# Altium footprint library Chronos.PcbLib: 65 footprints (part 3 of 5)
Each footprint in its own frame and in the unit in brackets; x right, y up, seen from the top. Pads: shape width x height; smd on the part's side, far side on the other; paste and mask are expansions set on the pad; w line width, h text height; cw(c..) or ccw(c..) is an arc to the next point about the centre after c.
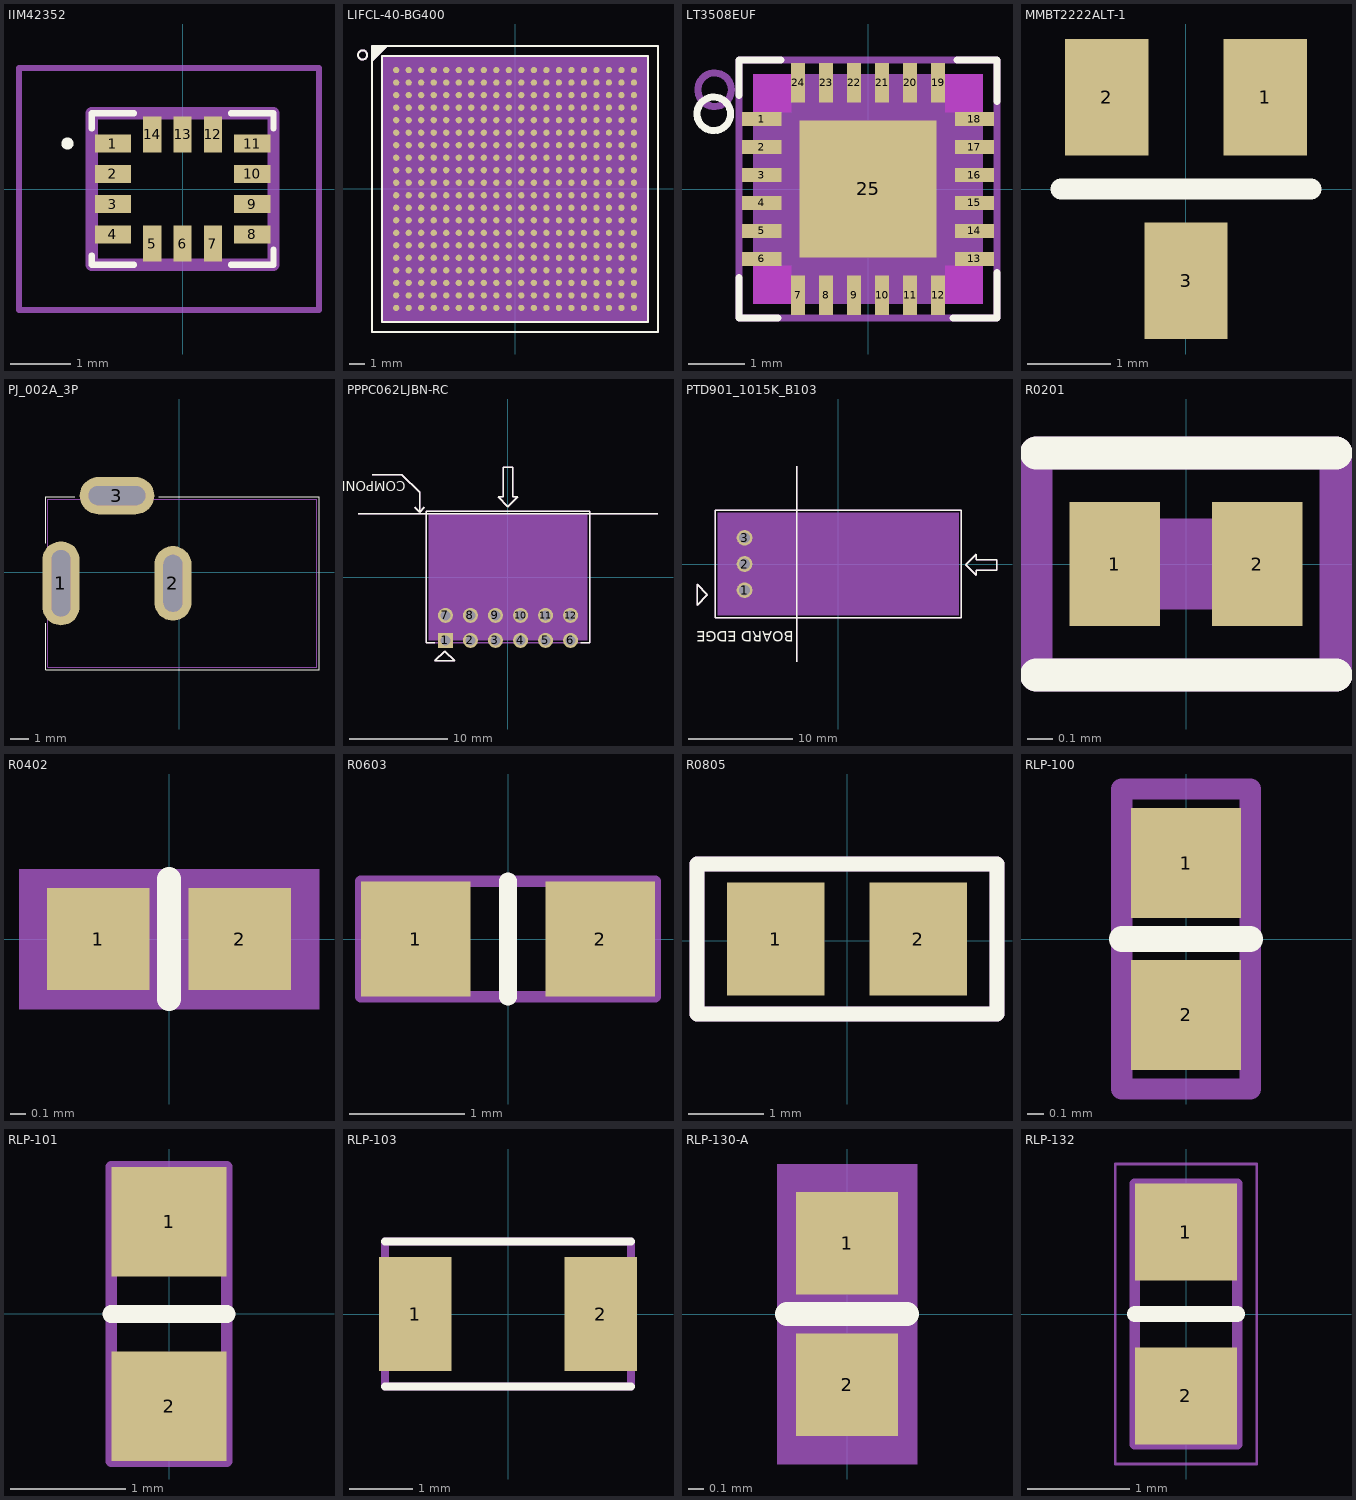
[diagram p2: the footprints below, top view; thin cyan lines are the x and y axes]

## IIM42352 [mm]
pads (14):
  rect 0.6x0.3 smd: 1(-1.15,0.75) 2(-1.15,0.25) 3(-1.15,-0.25) 4(-1.15,-0.75) 8(1.15,-0.75) 9(1.15,-0.25) 10(1.15,0.25) 11(1.15,0.75)
  rect 0.3x0.6 smd: 5(-0.5,-0.9) 6(0,-0.9) 7(0.5,-0.9) 12(0.5,0.9) 13(0,0.9) 14(-0.5,0.9)
Top Overlay:
  lines w0.1: -1.5,-1.1 -1.5,-1.25 -0.8,-1.25 ; -1.5,1 -1.5,1.25 -0.8,1.25 ; 0.8,-1.25 1.5,-1.25 1.5,-1 ; 0.8,1.25 1.5,1.25 1.5,1 ; -1.9,0.7 cw(c-1.9,0.75) -1.9,0.8 cw(c-1.9,0.75) -1.9,0.7
Mechanical 13:
  lines w0.2: -1.5,-1.25 1.5,-1.25 1.5,1.25 -1.5,1.25 -1.5,-1.25
Mechanical 15:
  lines w0.1: -2.7,-2 2.25,-2 2.25,2 -2.7,2 -2.7,-2
3D body "ICM-42688-P.stp": height 0.9, standoff -0.01, extent -1.5,-1.25 1.5,1.25

## LIFCL-40-BG400 [mm] "LIFCL-40-BG400"
pads (400):
  round 0.4 smd: A1(-7.6,7.6) A2(-6.8,7.6) A3(-6,7.6) A4(-5.2,7.6) A5(-4.4,7.6) A6(-3.6,7.6) A7(-2.8,7.6) A8(-2,7.6) A9(-1.2,7.6) A10(-0.4,7.6) A11(0.4,7.6) A12(1.2,7.6) A13(2,7.6) A14(2.8,7.6) A15(3.6,7.6) A16(4.4,7.6) A17(5.2,7.6) A18(6,7.6) A19(6.8,7.6) A20(7.6,7.6) B1(-7.6,6.8) B2(-6.8,6.8) B3(-6,6.8) B4(-5.2,6.8) B5(-4.4,6.8) B6(-3.6,6.8) B7(-2.8,6.8) B8(-2,6.8) B9(-1.2,6.8) B10(-0.4,6.8) B11(0.4,6.8) B12(1.2,6.8) B13(2,6.8) B14(2.8,6.8) B15(3.6,6.8) B16(4.4,6.8) B17(5.2,6.8) B18(6,6.8) B19(6.8,6.8) B20(7.6,6.8) C1(-7.6,6) C2(-6.8,6) C3(-6,6) C4(-5.2,6) C5(-4.4,6) C6(-3.6,6) C7(-2.8,6) C8(-2,6) C9(-1.2,6) C10(-0.4,6) C11(0.4,6) C12(1.2,6) C13(2,6) C14(2.8,6) C15(3.6,6) C16(4.4,6) C17(5.2,6) C18(6,6) C19(6.8,6) C20(7.6,6) D1(-7.6,5.2) D2(-6.8,5.2) D3(-6,5.2) D4(-5.2,5.2) D5(-4.4,5.2) D6(-3.6,5.2) D7(-2.8,5.2) D8(-2,5.2) D9(-1.2,5.2) D10(-0.4,5.2) D11(0.4,5.2) D12(1.2,5.2) D13(2,5.2) D14(2.8,5.2) D15(3.6,5.2) D16(4.4,5.2) D17(5.2,5.2) D18(6,5.2) D19(6.8,5.2) D20(7.6,5.2) E1(-7.6,4.4) E2(-6.8,4.4) E3(-6,4.4) E4(-5.2,4.4) E5(-4.4,4.4) E6(-3.6,4.4) E7(-2.8,4.4) E8(-2,4.4) E9(-1.2,4.4) E10(-0.4,4.4) E11(0.4,4.4) E12(1.2,4.4) E13(2,4.4) E14(2.8,4.4) E15(3.6,4.4) E16(4.4,4.4) E17(5.2,4.4) E18(6,4.4) E19(6.8,4.4) E20(7.6,4.4) F1(-7.6,3.6) F2(-6.8,3.6) F3(-6,3.6) F4(-5.2,3.6) F5(-4.4,3.6) F6(-3.6,3.6) F7(-2.8,3.6) F8(-2,3.6) F9(-1.2,3.6) F10(-0.4,3.6) F11(0.4,3.6) F12(1.2,3.6) F13(2,3.6) F14(2.8,3.6) F15(3.6,3.6) F16(4.4,3.6) F17(5.2,3.6) F18(6,3.6) F19(6.8,3.6) F20(7.6,3.6) G1(-7.6,2.8) G2(-6.8,2.8) G3(-6,2.8) G4(-5.2,2.8) G5(-4.4,2.8) G6(-3.6,2.8) G7(-2.8,2.8) G8(-2,2.8) G9(-1.2,2.8) G10(-0.4,2.8) G11(0.4,2.8) G12(1.2,2.8) G13(2,2.8) G14(2.8,2.8) G15(3.6,2.8) G16(4.4,2.8) G17(5.2,2.8) G18(6,2.8) G19(6.8,2.8) G20(7.6,2.8) H1(-7.6,2) H2(-6.8,2) H3(-6,2) H4(-5.2,2) H5(-4.4,2) H6(-3.6,2) H7(-2.8,2) H8(-2,2) H9(-1.2,2) H10(-0.4,2) H11(0.4,2) H12(1.2,2) H13(2,2) H14(2.8,2) H15(3.6,2) H16(4.4,2) H17(5.2,2) H18(6,2) H19(6.8,2) H20(7.6,2) J1(-7.6,1.2) J2(-6.8,1.2) J3(-6,1.2) J4(-5.2,1.2) J5(-4.4,1.2) J6(-3.6,1.2) J7(-2.8,1.2) J8(-2,1.2) J9(-1.2,1.2) J10(-0.4,1.2) J11(0.4,1.2) J12(1.2,1.2) J13(2,1.2) J14(2.8,1.2) J15(3.6,1.2) J16(4.4,1.2) J17(5.2,1.2) J18(6,1.2) J19(6.8,1.2) J20(7.6,1.2) K1(-7.6,0.4) K2(-6.8,0.4) K3(-6,0.4) K4(-5.2,0.4) K5(-4.4,0.4) K6(-3.6,0.4) K7(-2.8,0.4) K8(-2,0.4) K9(-1.2,0.4) K10(-0.4,0.4) K11(0.4,0.4) K12(1.2,0.4) K13(2,0.4) K14(2.8,0.4) K15(3.6,0.4) K16(4.4,0.4) K17(5.2,0.4) K18(6,0.4) K19(6.8,0.4) K20(7.6,0.4) L1(-7.6,-0.4) L2(-6.8,-0.4) L3(-6,-0.4) L4(-5.2,-0.4) L5(-4.4,-0.4) L6(-3.6,-0.4) L7(-2.8,-0.4) L8(-2,-0.4) L9(-1.2,-0.4) L10(-0.4,-0.4) L11(0.4,-0.4) L12(1.2,-0.4) L13(2,-0.4) L14(2.8,-0.4) L15(3.6,-0.4) L16(4.4,-0.4) L17(5.2,-0.4) L18(6,-0.4) L19(6.8,-0.4) L20(7.6,-0.4) M1(-7.6,-1.2) M2(-6.8,-1.2) M3(-6,-1.2) M4(-5.2,-1.2) M5(-4.4,-1.2) M6(-3.6,-1.2) M7(-2.8,-1.2) M8(-2,-1.2) M9(-1.2,-1.2) M10(-0.4,-1.2) M11(0.4,-1.2) M12(1.2,-1.2) M13(2,-1.2) M14(2.8,-1.2) M15(3.6,-1.2) M16(4.4,-1.2) M17(5.2,-1.2) M18(6,-1.2) M19(6.8,-1.2) M20(7.6,-1.2) N1(-7.6,-2) N2(-6.8,-2) N3(-6,-2) N4(-5.2,-2) N5(-4.4,-2) N6(-3.6,-2) N7(-2.8,-2) N8(-2,-2) N9(-1.2,-2) N10(-0.4,-2) N11(0.4,-2) N12(1.2,-2) N13(2,-2) N14(2.8,-2) N15(3.6,-2) N16(4.4,-2) N17(5.2,-2) N18(6,-2) N19(6.8,-2) N20(7.6,-2) P1(-7.6,-2.8) P2(-6.8,-2.8) P3(-6,-2.8) P4(-5.2,-2.8) P5(-4.4,-2.8) P6(-3.6,-2.8) P7(-2.8,-2.8) P8(-2,-2.8) P9(-1.2,-2.8) P10(-0.4,-2.8) P11(0.4,-2.8) P12(1.2,-2.8) P13(2,-2.8) P14(2.8,-2.8) P15(3.6,-2.8) P16(4.4,-2.8) P17(5.2,-2.8) P18(6,-2.8) P19(6.8,-2.8) P20(7.6,-2.8) R1(-7.6,-3.6) R2(-6.8,-3.6) R3(-6,-3.6) R4(-5.2,-3.6) R5(-4.4,-3.6) R6(-3.6,-3.6) R7(-2.8,-3.6) R8(-2,-3.6) R9(-1.2,-3.6) R10(-0.4,-3.6) R11(0.4,-3.6) R12(1.2,-3.6) R13(2,-3.6) R14(2.8,-3.6) R15(3.6,-3.6) R16(4.4,-3.6) R17(5.2,-3.6) R18(6,-3.6) R19(6.8,-3.6) R20(7.6,-3.6) T1(-7.6,-4.4) T2(-6.8,-4.4) T3(-6,-4.4) T4(-5.2,-4.4) T5(-4.4,-4.4) T6(-3.6,-4.4) T7(-2.8,-4.4) T8(-2,-4.4) T9(-1.2,-4.4) T10(-0.4,-4.4) T11(0.4,-4.4) T12(1.2,-4.4) T13(2,-4.4) T14(2.8,-4.4) T15(3.6,-4.4) T16(4.4,-4.4) T17(5.2,-4.4) T18(6,-4.4) T19(6.8,-4.4) T20(7.6,-4.4) U1(-7.6,-5.2) U2(-6.8,-5.2) U3(-6,-5.2) U4(-5.2,-5.2) U5(-4.4,-5.2) U6(-3.6,-5.2) U7(-2.8,-5.2) U8(-2,-5.2) U9(-1.2,-5.2) U10(-0.4,-5.2) U11(0.4,-5.2) U12(1.2,-5.2) U13(2,-5.2) U14(2.8,-5.2) U15(3.6,-5.2) U16(4.4,-5.2) U17(5.2,-5.2) U18(6,-5.2) U19(6.8,-5.2) U20(7.6,-5.2) V1(-7.6,-6) V2(-6.8,-6) V3(-6,-6) V4(-5.2,-6) V5(-4.4,-6) V6(-3.6,-6) V7(-2.8,-6) V8(-2,-6) V9(-1.2,-6) V10(-0.4,-6) V11(0.4,-6) V12(1.2,-6) V13(2,-6) V14(2.8,-6) V15(3.6,-6) V16(4.4,-6) V17(5.2,-6) V18(6,-6) V19(6.8,-6) V20(7.6,-6) W1(-7.6,-6.8) W2(-6.8,-6.8) W3(-6,-6.8) W4(-5.2,-6.8) W5(-4.4,-6.8) W6(-3.6,-6.8) W7(-2.8,-6.8) W8(-2,-6.8) W9(-1.2,-6.8) W10(-0.4,-6.8) W11(0.4,-6.8) W12(1.2,-6.8) W13(2,-6.8) W14(2.8,-6.8) W15(3.6,-6.8) W16(4.4,-6.8) W17(5.2,-6.8) W18(6,-6.8) W19(6.8,-6.8) W20(7.6,-6.8) Y1(-7.6,-7.6) Y2(-6.8,-7.6) Y3(-6,-7.6) Y4(-5.2,-7.6) Y5(-4.4,-7.6) Y6(-3.6,-7.6) Y7(-2.8,-7.6) Y8(-2,-7.6) Y9(-1.2,-7.6) Y10(-0.4,-7.6) Y11(0.4,-7.6) Y12(1.2,-7.6) Y13(2,-7.6) Y14(2.8,-7.6) Y15(3.6,-7.6) Y16(4.4,-7.6) Y17(5.2,-7.6) Y18(6,-7.6) Y19(6.8,-7.6) Y20(7.6,-7.6)
Top Overlay:
  circle w0.127: c-9.748,8.566 r0.292
  dashed: -9.135,9.135 -9.135,8.135 -8.135,9.135
  lines w0.127: -9.135,-9.135 9.135,-9.135 9.135,9.135 -9.135,9.135 -9.135,-9.135 ; -8.5,-8.5 8.5,-8.5 8.5,8.5 -8.5,8.5 -8.5,-8.5
Top 3D Body:
  region: 8.5,-8.5 8.5,8.5 -8.5,8.5 -8.5,-8.5
Top Assembly:
  circle w0.127: c-9.748,8.566 r0.292
  dashed: -9.135,9.135 -9.135,8.135 -8.135,9.135
  lines w0.127: -9.135,-9.135 9.135,-9.135 9.135,9.135 -9.135,9.135 -9.135,-9.135 ; -8.5,-8.5 8.5,-8.5 8.5,8.5 -8.5,8.5 -8.5,-8.5
  text ".Designator" at 9.94,6.12 h1.02
Mechanical 29:
  text "A12" at 0.984,7.6 h0.18
  text "A13" at 1.784,7.6 h0.18
  text "A15" at 3.384,7.6 h0.18
  text "A16" at 4.184,7.6 h0.18
  text "T16" at 4.184,-4.4 h0.18
  text "C11" at 0.184,6 h0.18
  text "C12" at 0.984,6 h0.18
  text "D6" at -3.744,5.2 h0.18
  text "D8" at -2.144,5.2 h0.18
  text "D3" at -6.144,5.2 h0.18
  text "D7" at -2.944,5.2 h0.18
  text "R15" at 3.384,-3.6 h0.18
  text "E9" at -1.344,4.4 h0.18
  text "U20" at 7.384,-5.2 h0.18
  text "E8" at -2.144,4.4 h0.18
  text "V3" at -6.144,-6 h0.18
  text "P11" at 0.184,-2.8 h0.18
  text "W14" at 2.584,-6.8 h0.18
  text "U1" at -7.744,-5.2 h0.18
  text "Y16" at 4.184,-7.6 h0.18
  text "L14" at 2.584,-0.4 h0.18
  text "Y9" at -1.344,-7.6 h0.18
  text "Y17" at 4.984,-7.6 h0.18
  text "W7" at -2.944,-6.8 h0.18
  text "W13" at 1.784,-6.8 h0.18
  text "N19" at 6.584,-2 h0.18
  text "U6" at -3.744,-5.2 h0.18
  text "V6" at -3.744,-6 h0.18
  text "W17" at 4.984,-6.8 h0.18
  text "Y3" at -6.144,-7.6 h0.18
  text "D15" at 3.384,5.2 h0.18
  text "W6" at -3.744,-6.8 h0.18
  text "W10" at -0.616,-6.8 h0.18
  text "D13" at 1.784,5.2 h0.18
  text "P10" at -0.616,-2.8 h0.18
  text "R13" at 1.784,-3.6 h0.18
  text "Y10" at -0.616,-7.6 h0.18
  text "W12" at 0.984,-6.8 h0.18
  text "P7" at -2.944,-2.8 h0.18
  text "U7" at -2.944,-5.2 h0.18
  text "T11" at 0.184,-4.4 h0.18
  text "W9" at -1.344,-6.8 h0.18
  text "T18" at 5.784,-4.4 h0.18
  text "U18" at 5.784,-5.2 h0.18
  text "V8" at -2.144,-6 h0.18
  text "T9" at -1.344,-4.4 h0.18
  text "U14" at 2.584,-5.2 h0.18
  text "E12" at 0.984,4.4 h0.18
  text "V11" at 0.184,-6 h0.18
  text "W15" at 3.384,-6.8 h0.18
  text "P18" at 5.784,-2.8 h0.18
  text "B9" at -1.344,6.8 h0.18
  text "T1" at -7.744,-4.4 h0.18
  text "A8" at -2.144,7.6 h0.18
  text "Y8" at -2.144,-7.6 h0.18
  text "B10" at -0.616,6.8 h0.18
  text "E13" at 1.784,4.4 h0.18
  text "U11" at 0.184,-5.2 h0.18
  text "A10" at -0.616,7.6 h0.18
  text "R10" at -0.616,-3.6 h0.18
  text "B6" at -3.744,6.8 h0.18
  text "A6" at -3.744,7.6 h0.18
  text "Y11" at 0.184,-7.6 h0.18
  text "A9" at -1.344,7.6 h0.18
  text "V7" at -2.944,-6 h0.18
  text "B7" at -2.944,6.8 h0.18
  text "W8" at -2.144,-6.8 h0.18
  text "A7" at -2.944,7.6 h0.18
  text "R5" at -4.544,-3.6 h0.18
  text "B8" at -2.144,6.8 h0.18
  text "W1" at -7.744,-6.8 h0.18
  text "Y12" at 0.984,-7.6 h0.18
  text "V12" at 0.984,-6 h0.18
  text "V9" at -1.344,-6 h0.18
  text "T7" at -2.944,-4.4 h0.18
  text "V14" at 2.584,-6 h0.18
  text "P8" at -2.144,-2.8 h0.18
  text "Y18" at 5.784,-7.6 h0.18
  text "T6" at -3.744,-4.4 h0.18
  text "N10" at -0.616,-2 h0.18
  text "N12" at 0.984,-2 h0.18
  text "K12" at 0.984,0.4 h0.18
  text "N8" at -2.144,-2 h0.18
  text "K9" at -1.344,0.4 h0.18
  text "H9" at -1.344,2 h0.18
  text "W11" at 0.184,-6.8 h0.18
  text "U16" at 4.184,-5.2 h0.18
  text "P20" at 7.384,-2.8 h0.18
  text "Y2" at -6.944,-7.6 h0.18
  text "V10" at -0.616,-6 h0.18
  text "R11" at 0.184,-3.6 h0.18
  text "Y7" at -2.944,-7.6 h0.18
  text "P17" at 4.984,-2.8 h0.18
  text "A2" at -6.944,7.6 h0.18
  text "Y6" at -3.744,-7.6 h0.18
  text "D2" at -6.944,5.2 h0.18
  text "Y15" at 3.384,-7.6 h0.18
  text "A3" at -6.144,7.6 h0.18
  text "P13" at 1.784,-2.8 h0.18
  text "T12" at 0.984,-4.4 h0.18
  text "P9" at -1.344,-2.8 h0.18
  text "V16" at 4.184,-6 h0.18
  text "F20" at 7.384,3.6 h0.18
  text "A4" at -5.344,7.6 h0.18
  text "T10" at -0.616,-4.4 h0.18
  text "B4" at -5.344,6.8 h0.18
  text "P12" at 0.984,-2.8 h0.18
  text "C1" at -7.744,6 h0.18
  text "U12" at 0.984,-5.2 h0.18
  text "R7" at -2.944,-3.6 h0.18
  text "D1" at -7.744,5.2 h0.18
  text "N20" at 7.384,-2 h0.18
  text "B3" at -6.144,6.8 h0.18
  text "R12" at 0.984,-3.6 h0.18
  text "E20" at 7.384,4.4 h0.18
  text "B2" at -6.944,6.8 h0.18
  text "U15" at 3.384,-5.2 h0.18
  text "G14" at 2.584,2.8 h0.18
  text "Y14" at 2.584,-7.6 h0.18
  text "Y13" at 1.784,-7.6 h0.18
  text "H12" at 0.984,2 h0.18
  text "R6" at -3.744,-3.6 h0.18
  text "B1" at -7.744,6.8 h0.18
  text "V17" at 4.984,-6 h0.18
  text "T8" at -2.144,-4.4 h0.18
  text "V1" at -7.744,-6 h0.18
  text "W18" at 5.784,-6.8 h0.18
  text "P19" at 6.584,-2.8 h0.18
  text "R9" at -1.344,-3.6 h0.18
  text "M19" at 6.584,-1.2 h0.18
  text "U10" at -0.616,-5.2 h0.18
  text "R8" at -2.144,-3.6 h0.18
  text "T14" at 2.584,-4.4 h0.18
  text "C2" at -6.944,6 h0.18
  text "T13" at 1.784,-4.4 h0.18
  text "E16" at 4.184,4.4 h0.18
  text "N14" at 2.584,-2 h0.18
  text "Y5" at -4.544,-7.6 h0.18
  text "B5" at -4.544,6.8 h0.18
  text "W5" at -4.544,-6.8 h0.18
  text "T17" at 4.984,-4.4 h0.18
  text "C4" at -5.344,6 h0.18
  text "R16" at 4.184,-3.6 h0.18
  text "N13" at 1.784,-2 h0.18
  text "P14" at 2.584,-2.8 h0.18
  text "E19" at 6.584,4.4 h0.18
  text "B13" at 1.784,6.8 h0.18
  text "B15" at 3.384,6.8 h0.18
  text "G15" at 3.384,2.8 h0.18
  text "M20" at 7.384,-1.2 h0.18
  text "V20" at 7.384,-6 h0.18
  text "W20" at 7.384,-6.8 h0.18
  text "T20" at 7.384,-4.4 h0.18
  text "R18" at 5.784,-3.6 h0.18
  text "B11" at 0.184,6.8 h0.18
  text "K2" at -6.944,0.4 h0.18
  text "J1" at -7.744,1.2 h0.18
  text "K4" at -5.344,0.4 h0.18
  text "K1" at -7.744,0.4 h0.18
  text "K3" at -6.144,0.4 h0.18
  text "E18" at 5.784,4.4 h0.18
  text "N11" at 0.184,-2 h0.18
  text "N9" at -1.344,-2 h0.18
  text "L9" at -1.344,-0.4 h0.18
  text "L12" at 0.984,-0.4 h0.18
  text "J12" at 0.984,1.2 h0.18
  text "F12" at 0.984,3.6 h0.18
  text "F9" at -1.344,3.6 h0.18
  text "J9" at -1.344,1.2 h0.18
  text "D17" at 4.984,5.2 h0.18
  text "J2" at -6.944,1.2 h0.18
  text "C14" at 2.584,6 h0.18
  text "C9" at -1.344,6 h0.18
  text "B14" at 2.584,6.8 h0.18
  text "C7" at -2.944,6 h0.18
  text "C5" at -4.544,6 h0.18
  text "R17" at 4.984,-3.6 h0.18
  text "C13" at 1.784,6 h0.18
  text "D4" at -5.344,5.2 h0.18
  text "F1" at -7.744,3.6 h0.18
  text "E3" at -6.144,4.4 h0.18
  text "E4" at -5.344,4.4 h0.18
  text "D9" at -1.344,5.2 h0.18
  text "E7" at -2.944,4.4 h0.18
  text "E2" at -6.944,4.4 h0.18
  text "E10" at -0.616,4.4 h0.18
  text "D10" at -0.616,5.2 h0.18
  text "D5" at -4.544,5.2 h0.18
  text "U17" at 4.984,-5.2 h0.18
  text "G20" at 7.384,2.8 h0.18
  text "J13" at 1.784,1.2 h0.18
  text "K14" at 2.584,0.4 h0.18
  text "J14" at 2.584,1.2 h0.18
  text "H16" at 4.184,2 h0.18
  text "K15" at 3.384,0.4 h0.18
  text "K16" at 4.184,0.4 h0.18
  text "H19" at 6.584,2 h0.18
  text "H20" at 7.384,2 h0.18
  text "H17" at 4.984,2 h0.18
  text "K17" at 4.984,0.4 h0.18
  text "H13" at 1.784,2 h0.18
  text "K18" at 5.784,0.4 h0.18
  text "K19" at 6.584,0.4 h0.18
  text "K20" at 7.384,0.4 h0.18
  text "L18" at 5.784,-0.4 h0.18
  text "L17" at 4.984,-0.4 h0.18
  text "H18" at 5.784,2 h0.18
  text "H14" at 2.584,2 h0.18
  text "H15" at 3.384,2 h0.18
  text "J15" at 3.384,1.2 h0.18
  text "J16" at 4.184,1.2 h0.18
  text "J19" at 6.584,1.2 h0.18
  text "J20" at 7.384,1.2 h0.18
  text "K13" at 1.784,0.4 h0.18
  text "R20" at 7.384,-3.6 h0.18
  text "R19" at 6.584,-3.6 h0.18
  text "P16" at 4.184,-2.8 h0.18
  text "P15" at 3.384,-2.8 h0.18
  text "T5" at -4.544,-4.4 h0.18
  text "U5" at -4.544,-5.2 h0.18
  text "V5" at -4.544,-6 h0.18
  text "T4" at -5.344,-4.4 h0.18
  text "U4" at -5.344,-5.2 h0.18
  text "V4" at -5.344,-6 h0.18
  text "W4" at -5.344,-6.8 h0.18
  text "Y4" at -5.344,-7.6 h0.18
  text "T3" at -6.144,-4.4 h0.18
  text "U3" at -6.144,-5.2 h0.18
  text "T2" at -6.944,-4.4 h0.18
  text "U2" at -6.944,-5.2 h0.18
  text "V2" at -6.944,-6 h0.18
  text "W2" at -6.944,-6.8 h0.18
  text "N3" at -6.144,-2 h0.18
  text "N2" at -6.944,-2 h0.18
  text "N1" at -7.744,-2 h0.18
  text "M1" at -7.744,-1.2 h0.18
  text "F7" at -2.944,3.6 h0.18
  text "F6" at -3.744,3.6 h0.18
  text "F5" at -4.544,3.6 h0.18
  text "F4" at -5.344,3.6 h0.18
  text "G2" at -6.944,2.8 h0.18
  text "G1" at -7.744,2.8 h0.18
  text "G8" at -2.144,2.8 h0.18
  text "H8" at -2.144,2 h0.18
  text "H7" at -2.944,2 h0.18
  text "H6" at -3.744,2 h0.18
  text "H5" at -4.544,2 h0.18
  text "G7" at -2.944,2.8 h0.18
  text "G6" at -3.744,2.8 h0.18
  text "F8" at -2.144,3.6 h0.18
  text "H2" at -6.944,2 h0.18
  text "H1" at -7.744,2 h0.18
  text "F3" at -6.144,3.6 h0.18
  text "F2" at -6.944,3.6 h0.18
  text "G5" at -4.544,2.8 h0.18
  text "G4" at -5.344,2.8 h0.18
  text "J8" at -2.144,1.2 h0.18
  text "J7" at -2.944,1.2 h0.18
  text "G3" at -6.144,2.8 h0.18
  text "J6" at -3.744,1.2 h0.18
  text "J5" at -4.544,1.2 h0.18
  text "J4" at -5.344,1.2 h0.18
  text "J3" at -6.144,1.2 h0.18
  text "B20" at 7.384,6.8 h0.18
  text "C20" at 7.384,6 h0.18
  text "A19" at 6.584,7.6 h0.18
  text "A18" at 5.784,7.6 h0.18
  text "B18" at 5.784,6.8 h0.18
  text "C18" at 5.784,6 h0.18
  text "B17" at 4.984,6.8 h0.18
  text "D18" at 5.784,5.2 h0.18
  text "C16" at 4.184,6 h0.18
  text "Y19" at 6.584,-7.6 h0.18
  text "W19" at 6.584,-6.8 h0.18
  text "V19" at 6.584,-6 h0.18
  text "V18" at 5.784,-6 h0.18
  text "F18" at 5.784,3.6 h0.18
  text "F16" at 4.184,3.6 h0.18
  text "N16" at 4.184,-2 h0.18
  text "M18" at 5.784,-1.2 h0.18
  text "M16" at 4.184,-1.2 h0.18
  text "M17" at 4.984,-1.2 h0.18
  text "M14" at 2.584,-1.2 h0.18
  text "N15" at 3.384,-2 h0.18
  text "M15" at 3.384,-1.2 h0.18
  text "E17" at 4.984,4.4 h0.18
  text "L16" at 4.184,-0.4 h0.18
  text "L20" at 7.384,-0.4 h0.18
  text "F14" at 2.584,3.6 h0.18
  text "F13" at 1.784,3.6 h0.18
  text "G13" at 1.784,2.8 h0.18
  text "L19" at 6.584,-0.4 h0.18
  text "L15" at 3.384,-0.4 h0.18
  text "D16" at 4.184,5.2 h0.18
  text "D14" at 2.584,5.2 h0.18
  text "G19" at 6.584,2.8 h0.18
  text "E5" at -4.544,4.4 h0.18
  text "H3" at -6.144,2 h0.18
  text "P3" at -6.144,-2.8 h0.18
  text "L3" at -6.144,-0.4 h0.18
  text "V15" at 3.384,-6 h0.18
  text "U13" at 1.784,-5.2 h0.18
  text "G17" at 4.984,2.8 h0.18
  text "J18" at 5.784,1.2 h0.18
  text "M4" at -5.344,-1.2 h0.18
  text "M7" at -2.944,-1.2 h0.18
  text "L6" at -3.744,-0.4 h0.18
  text "D11" at 0.184,5.2 h0.18
  text "F17" at 4.984,3.6 h0.18
  text "F19" at 6.584,3.6 h0.18
  text "D12" at 0.984,5.2 h0.18
  text "R4" at -5.344,-3.6 h0.18
  text "R3" at -6.144,-3.6 h0.18
  text "G18" at 5.784,2.8 h0.18
  text "N6" at -3.744,-2 h0.18
  text "F15" at 3.384,3.6 h0.18
  text "M6" at -3.744,-1.2 h0.18
  text "L8" at -2.144,-0.4 h0.18
  text "L5" at -4.544,-0.4 h0.18
  text "M5" at -4.544,-1.2 h0.18
  text "L7" at -2.944,-0.4 h0.18
  text "K8" at -2.144,0.4 h0.18
  text "M3" at -6.144,-1.2 h0.18
  text "E15" at 3.384,4.4 h0.18
  text "N7" at -2.944,-2 h0.18
  text "P6" at -3.744,-2.8 h0.18
  text "N5" at -4.544,-2 h0.18
  text "K6" at -3.744,0.4 h0.18
  text "N4" at -5.344,-2 h0.18
  text "K7" at -2.944,0.4 h0.18
  text "K5" at -4.544,0.4 h0.18
  text "P1" at -7.744,-2.8 h0.18
  text "P5" at -4.544,-2.8 h0.18
  text "P2" at -6.944,-2.8 h0.18
  text "R1" at -7.744,-3.6 h0.18
  text "M2" at -6.944,-1.2 h0.18
  text "R2" at -6.944,-3.6 h0.18
  text "L2" at -6.944,-0.4 h0.18
  text "L1" at -7.744,-0.4 h0.18
  text "U19" at 6.584,-5.2 h0.18
  text "N17" at 4.984,-2 h0.18
  text "E11" at 0.184,4.4 h0.18
  text "L13" at 1.784,-0.4 h0.18
  text "W3" at -6.144,-6.8 h0.18
  text "W16" at 4.184,-6.8 h0.18
  text "Y1" at -7.744,-7.6 h0.18
  text "V13" at 1.784,-6 h0.18
  text "Y20" at 7.384,-7.6 h0.18
  text "L4" at -5.344,-0.4 h0.18
  text "P4" at -5.344,-2.8 h0.18
  text "R14" at 2.584,-3.6 h0.18
  text "M13" at 1.784,-1.2 h0.18
  text "M8" at -2.144,-1.2 h0.18
  text "M9" at -1.344,-1.2 h0.18
  text "L10" at -0.616,-0.4 h0.18
  text "M10" at -0.616,-1.2 h0.18
  text "N18" at 5.784,-2 h0.18
  text "T19" at 6.584,-4.4 h0.18
  text "T15" at 3.384,-4.4 h0.18
  text "E6" at -3.744,4.4 h0.18
  text "H4" at -5.344,2 h0.18
  text "E1" at -7.744,4.4 h0.18
  text "F11" at 0.184,3.6 h0.18
  text "G9" at -1.344,2.8 h0.18
  text "K10" at -0.616,0.4 h0.18
  text "J10" at -0.616,1.2 h0.18
  text "H10" at -0.616,2 h0.18
  text "G10" at -0.616,2.8 h0.18
  text "F10" at -0.616,3.6 h0.18
  text "G11" at 0.184,2.8 h0.18
  text "G12" at 0.984,2.8 h0.18
  text "G16" at 4.184,2.8 h0.18
  text "A1" at -7.744,7.6 h0.18
  text "A5" at -4.544,7.6 h0.18
  text "C3" at -6.144,6 h0.18
  text "C6" at -3.744,6 h0.18
  text "C10" at -0.616,6 h0.18
  text "U9" at -1.344,-5.2 h0.18
  text "U8" at -2.144,-5.2 h0.18
  text "C8" at -2.144,6 h0.18
  text "H11" at 0.184,2 h0.18
  text "J11" at 0.184,1.2 h0.18
  text "K11" at 0.184,0.4 h0.18
  text "L11" at 0.184,-0.4 h0.18
  text "M11" at 0.184,-1.2 h0.18
  text "M12" at 0.984,-1.2 h0.18
  text "J17" at 4.984,1.2 h0.18
  text "E14" at 2.584,4.4 h0.18
  text "A14" at 2.584,7.6 h0.18
  text "A11" at 0.184,7.6 h0.18
  text "B12" at 0.984,6.8 h0.18
  text "C15" at 3.384,6 h0.18
  text "B16" at 4.184,6.8 h0.18
  text "C17" at 4.984,6 h0.18
  text "D20" at 7.384,5.2 h0.18
  text "D19" at 6.584,5.2 h0.18
  text "C19" at 6.584,6 h0.18
  text "B19" at 6.584,6.8 h0.18
  text "A17" at 4.984,7.6 h0.18
  text "A20" at 7.384,7.6 h0.18
3D body "BG400C.STEP": height 1, standoff 0, extent -8.5,-8.5 8.5,8.5

## LT3508EUF [mm] "LT3508EUF"
pads (25):
  rect 0.7x0.25 smd: 1(-1.9,1.25) 2(-1.9,0.75) 3(-1.9,0.25) 4(-1.9,-0.25) 5(-1.9,-0.75) 6(-1.9,-1.25) 13(1.9,-1.25) 14(1.9,-0.75) 15(1.9,-0.25) 16(1.9,0.25) 17(1.9,0.75) 18(1.9,1.25)
  rect 0.25x0.7 smd: 7(-1.25,-1.9) 8(-0.75,-1.9) 9(-0.25,-1.9) 10(0.25,-1.9) 11(0.75,-1.9) 12(1.25,-1.9) 19(1.25,1.9) 20(0.75,1.9) 21(0.25,1.9) 22(-0.25,1.9) 23(-0.75,1.9) 24(-1.25,1.9)
  rect 2.45x2.45 smd: 25(0,0)
Top Layer keep-out:
  region: -2.05,-1.375 -2.05,-2.05 -1.375,-2.05 -1.375,-1.375
  region: 2.05,-1.375 2.05,-2.05 1.375,-2.05 1.375,-1.375
  region: -2.05,1.375 -2.05,2.05 -1.375,2.05 -1.375,1.375
  region: 2.05,1.375 2.05,2.05 1.375,2.05 1.375,1.375
Top Overlay:
  circle w0.127: c-2.757,1.344 r0.3
  lines w0.127: -2.304,-1.581 -2.304,-2.304 -1.614,-2.304 ; -2.304,1.674 -2.304,2.304 -1.561,2.304 ; 1.521,-2.304 2.304,-2.304 2.304,-1.49 ; 1.588,2.304 2.304,2.304 2.304,1.569
  text ".Designator" at 5.864,1.253 h1.02
Top 3D Body:
  region: -2.05,2.05 -2.05,-2.05 2.05,-2.05 2.05,2.05
Top Assembly:
  circle w0.127: c-2.742,1.774 r0.3
  lines w0.127: -2.304,-2.304 -2.304,2.304 2.304,2.304 2.304,-2.304 -2.304,-2.304
Mechanical 29:
  text "23" at -0.75,1.494 h0.51
  text "20" at 0.75,1.494 h0.51
  text "11" at 0.75,-2.306 h0.51
  text "19" at 1.25,1.494 h0.51
  text "12" at 1.25,-2.306 h0.51
  text "21" at 0.25,1.494 h0.51
  text "17" at 1.9,0.344 h0.51
  text "8" at -0.75,-2.103 h0.51
  text "18" at 1.9,0.844 h0.51
  text "1" at -1.9,1.047 h0.51
  text "7" at -1.25,-2.103 h0.51
  text "24" at -1.25,1.494 h0.51
  text "22" at -0.25,1.494 h0.51
  text "2" at -1.9,0.547 h0.51
  text "10" at 0.25,-2.306 h0.51
  text "9" at -0.25,-2.103 h0.51
  text "25" at 0,-0.406 h0.51
  text "16" at 1.9,-0.156 h0.51
  text "15" at 1.9,-0.656 h0.51
  text "14" at 1.9,-1.156 h0.51
  text "13" at 1.9,-1.656 h0.51
  text "6" at -1.9,-1.453 h0.51
  text "5" at -1.9,-0.953 h0.51
  text "4" at -1.9,-0.453 h0.51
  text "3" at -1.9,0.047 h0.51
3D body "QFN-24_UF_LIT.step": height 0.8, standoff 0, extent -2.05,-2.05 2.05,2.05

## MMBT2222ALT-1 [mm] "MMBT2222ALT-1"
pads (3):
  rect 1x1.4 smd: 1(0.956,1.1) 2(-0.944,1.1) 3(0.006,-1.1)
Top Overlay:
  lines w0.254: -1.495,0 1.507,0
Mechanical 29:
  text "2" at -0.944,1.354 h0.64
  text "3" at 0.006,-0.846 h0.64
  text "1" at 0.956,1.354 h0.64
3D body "ROHM - SST3 - SOT-23.step": height 1.2, standoff 0, extent -1.45,-1.123 1.45,1.377

## PJ_002A_3P [mm] "PJ_002A_3P"
pads (3):
  oval 2x4.5 hole 1.016 slot 3.556 at 90 deg: 1(-6.35,-0.6)
  oval 2x4 hole 1.016 slot 3.048 at 90 deg: 2(-0.35,-0.6)
  oval 4x2 hole 1.016 slot 3.048 at 0 deg: 3(-3.35,4.1)
Top Overlay:
  lines w0.025: -7.177,-2.75 -7.177,-5.227 7.477,-5.227 7.477,4.027 -1.1,4.027 ; -7.177,1.55 -7.177,4.027 -5.6,4.027
  text ".Designator" at -0.03,4.715 h1.02
Top Assembly:
  lines w0.025: -7.05,-5.1 -7.05,3.9 7.35,3.9 7.35,-5.1 -7.05,-5.1
  text "2" at -0.956,-7.04 h1.6
  text "3" at -3.951,5.558 h1.6
  text "1" at -8.803,-1.322 h1.6
Mechanical 29:
  text "2" at -0.35,-0.194 h1.02
  text "3" at -3.35,4.506 h1.02
  text "1" at -6.35,0.213 h1.02
Mechanical34:
  text "MFG P/N:PJ-002A" at -22.101,-24.332 h1.27
  text "MFG:CUI" at -22.101,-21.932 h1.27
Mechanical35:
  text "A.C.T" at -22.101,-19.532 h1.27
Mechanical38:
  text "COMP HEIGHT:11.0mm" at -22.801,14.768 h1.27
  text "PADSTACK(S):1_0x3_5h2_0w4_5o,1_0x3_0h2_0w4_0o" at -22.801,16.968 h1.27
  text "SYMBOL NAME:pj_002a_3p" at -22.901,19.168 h1.27
3D body "step_temp.STEP": height 11.1, standoff -3.4, extent -7.073,-5.336 7.327,4.064

## PPPC062LJBN-RC [mil] "PPPC062LJBN-RC"
pads (12):
  rect 60x60 hole 40: 1(-250,-252.76)
  round 60 hole 40: 2(-150,-252.76) 3(-50,-252.76) 4(50,-252.76) 5(150,-252.76) 6(250,-252.76) 7(-250,-152.76) 8(-150,-152.76) 9(-50,-152.76) 10(50,-152.76) 11(150,-152.76) 12(250,-152.76)
Top Overlay:
  lines w5: -599.59,252.75 599.59,252.75 ; -542.52,409.75 -424.41,409.75 -353.55,338.88 -353.55,260.14 ; -373.23,279.82 -353.55,260.14 ; -333.86,279.82 -353.55,260.14 ; -293.29,-262.75 -326.73,-262.75 -326.73,262.75 326.73,262.75 326.73,-262.75 291.78,-262.75 ; -292.51,-334.75 -213.77,-334.75 -253.14,-295.38 -292.51,-334.75 ; -39.5,321.47 -19.81,321.47 -19.81,439.58 19.56,439.58 19.56,321.47 39.24,321.47 -0.13,282.1 -39.5,321.47
  text ".Designator" at 382.54,-69.77 h40
  text "COMPONENT EDGE" at -409.63,383.32 h40
Top 3D Body:
  region: 316.73,-252.75 316.73,252.75 -316.73,252.75 -316.73,-252.75
Top Assembly:
  lines w5: -599.59,252.75 599.59,252.75 ; -542.52,409.75 -424.41,409.75 -353.55,338.88 -353.55,260.14 ; -373.23,279.82 -353.55,260.14 ; -333.86,279.82 -353.55,260.14 ; -326.73,-262.75 -326.73,262.75 326.73,262.75 326.73,-262.75 -326.73,-262.75 ; -292.51,-334.75 -213.77,-334.75 -253.14,-295.38 -292.51,-334.75 ; -39.5,321.47 -19.81,321.47 -19.81,439.58 19.56,439.58 19.56,321.47 39.24,321.47 -0.13,282.1 -39.5,321.47
  text "COMPONENT EDGE" at -409.63,383.32 h40
Mechanical 29:
  text "7" at -241.31,-166.1 h20
  text "4" at 48.69,-264.61 h20
  text "10" at 48.69,-172.6 h20
  text "3" at -51.31,-264.61 h20
  text "9" at -51.31,-164.6 h20
  text "2" at -151.31,-264.61 h20
  text "1" at -251.31,-264.61 h20
  text "8" at -151.31,-164.6 h20
  text "6" at 248.69,-264.61 h20
  text "12" at 248.69,-172.6 h20
  text "11" at 148.69,-172.6 h20
  text "5" at 148.69,-264.61 h20
Mechanical 32:
  text "LEAD LENGTH IS 124 MIL" at -325.6,-77.84 h40
3D body: height 150, standoff 0, extent -316.73,-252.75 316.73,252.75

## PTD901_1015K_B103 [mil] "PTD901_1015K_B103"
pads (3):
  round 59.06 hole 40: 1(-353.35,-98.43) 2(-353.35,0) 3(-353.35,98.43)
Top Overlay:
  lines w5: -156.5,-367.64 -156.5,367.64 ; -532.39,-155.53 -532.39,-76.79 -493.02,-116.16 -532.39,-155.53 ; -463.74,-202.91 463.74,-202.91 463.74,202.91 -463.74,202.91 -463.74,-202.91 ; 479.74,-3.46 519.11,-42.83 519.11,-23.14 597.85,-23.14 597.85,16.23 519.11,16.23 519.11,35.91 479.74,-3.46
  text "BOARD EDGE" at -168.5,-252.86 h40
  text ".Designator" at -475.5,-11.86 h40
Top 3D Body:
  region: 453.74,-192.91 453.74,192.91 -453.74,192.91 -453.74,-192.91
Top Assembly:
  lines w5: -156.5,-367.64 -156.5,367.64 ; -532.39,-155.53 -493.02,-116.16 -532.39,-76.79 -532.39,-155.53 ; -463.74,-202.91 463.74,-202.91 463.74,202.91 -463.74,202.91 -463.74,-202.91 ; 479.74,-3.46 519.11,-42.83 519.11,-23.14 597.85,-23.14 597.85,16.23 519.11,16.23 519.11,35.91 479.74,-3.46
  text "BOARD EDGE" at -173.59,239.57 h40
Mechanical 29:
  text "1" at -353.35,-106.43 h20
  text "2" at -353.35,-8 h20
  text "3" at -353.35,90.43 h20
Mechanical 32:
  text "LEAD LENGTH IS 3.5MM" at -290.63,-168.52 h40
3D body: height 150, standoff 0, extent -453.74,-192.91 453.74,192.91

## R0201 [mm] "R0201"
pads (2):
  rect 0.35x0.48 smd: 1(-0.275,0) 2(0.275,0)
Top Overlay:
  lines w0.127: -0.579,-0.429 0.579,-0.429 ; -0.579,0.429 0.579,0.429
Top 3D Body:
  region: -0.325,0.175 -0.325,-0.175 0.325,-0.175 0.325,0.175
Top Assembly:
  lines w0.127: -0.579,-0.429 0.579,-0.429 0.579,0.429 -0.579,0.429 -0.579,-0.429
  text ".Designator" at 0.793,-0.048 h1.02
Mechanical 29:
  text "1" at -0.072,0 h0.51
  text "2" at 0.478,0 h0.51
3D body "RES 0201.STEP": height 0.22, standoff 0, extent -0.3,-0.15 0.3,0.15

## R0402 [mm] "R0402"
pads (2):
  rect 0.65x0.65 smd: 1(-0.45,0) 2(0.45,0)
Top Overlay:
  lines w0.152: 0,-0.381 0,0.381
Top 3D Body:
  region: -0.953,-0.445 0.953,-0.445 0.953,0.445 -0.953,0.445
Top Assembly:
  lines w0.127: -0.889,-0.381 0.889,-0.381 0.889,0.381 -0.889,0.381 -0.889,-0.381
Mechanical 29:
  text "2" at 0.45,0.203 h0.51
  text "1" at -0.45,0.203 h0.51
3D body "RES 0402.STEP": height 0.35, standoff 0, extent -0.5,-0.246 0.5,0.254

## R0603 [mm] "R0603"
pads (2):
  rect 0.95x1 smd: 1(-0.8,0) 2(0.8,0)
Top Overlay:
  lines w0.152: 0,-0.5 0,0.5
Top Assembly:
  lines w0.102: -1.275,-0.5 -1.275,0.5 1.275,0.5 1.275,-0.5 -1.275,-0.5
Mechanical 29:
  text "2" at 0.597,0 h0.51
  text "1" at -1.003,0 h0.51
Bottom Assembly:
  text ".Designator" at -1.524,-0.423 h1.27
3D body "RES 0603.STEP": height 0.45, standoff 0, extent -0.8,-0.419 0.8,0.381

## R0805 [mm] "R0805"
pads (2):
  rect 1.3x1.5 smd: 1(-0.95,0.025) 2(0.95,0.025)
Top Overlay:
  lines w0.203: -2,-0.975 -2,1.025 2,1.025 2,-0.975 -2,-0.975
  text ".Designator" at -3.175,-1.524 h1.02
Top Assembly:
  lines w0.203: -2,-0.975 -2,1.025 2,1.025 2,-0.975 -2,-0.975
Mechanical 29:
  text "2" at 1.458,0.025 h0.64
  text "1" at -0.442,0.025 h0.64
3D body "RES 0805.STEP": height 0.6, standoff 0, extent -1,-0.615 1,0.635

## RLP-100 [mm] "RLP-100"
pads (2):
  rect 0.65x0.65 smd: 1(0,0.45) 2(0,-0.45)
Top Overlay:
  lines w0.152: -0.381,0 0.381,0
Top Assembly:
  lines w0.127: -0.381,-0.889 -0.381,0.889 0.381,0.889 0.381,-0.889 -0.381,-0.889
Mechanical 29:
  text "1" at -0.203,0.45 h0.51
  text "2" at -0.203,-0.45 h0.51
3D body "RES 0402.STEP": height 0.35, standoff 0, extent -0.254,-0.5 0.246,0.5

## RLP-101 [mm] "RLP-101"
pads (2):
  rect 1x0.95 smd: 1(0,0.8) 2(0,-0.8)
Top Overlay:
  lines w0.152: -0.5,0 0.5,0
  text ".Designator" at 1.651,2.921 h1.02
Top Assembly:
  lines w0.102: -0.5,-1.275 0.5,-1.275 0.5,1.275 -0.5,1.275 -0.5,-1.275
Mechanical 29:
  text "2" at 0.203,-0.8 h0.51
  text "1" at 0.203,0.8 h0.51
3D body "RES 0603.STEP": height 0.45, standoff 0, extent -0.419,-0.8 0.381,0.8

## RLP-103 [mm] "RLP-103"
pads (2):
  rect 1.16x1.82 smd: 1(-1.475,0) 2(1.475,0)
Top Overlay:
  lines w0.127: -1.954,-1.154 1.954,-1.154 ; -1.954,1.154 1.954,1.154
  text ".Designator" at 3.175,1.778 h1.02
Top Assembly:
  lines w0.127: -1.954,-1.154 -1.954,1.154 1.954,1.154 1.954,-1.154 -1.954,-1.154
Mechanical 29:
  text "1" at -1.678,0 h0.51
  text "2" at 1.272,0 h0.51
3D body "RES 1206.STEP": height 0.6, standoff 0, extent -1.6,-0.762 1.6,0.838

## RLP-130-A [mm] "RLP-130-A"
pads (2):
  rect 0.65x0.65 smd: 1(0,0.45) 2(0,-0.45)
Top Overlay:
  lines w0.152: -0.381,0 0.381,0
Top 3D Body:
  region: -0.445,0.953 -0.445,-0.953 0.445,-0.953 0.445,0.953
Top Assembly:
  lines w0.127: -0.381,-0.889 0.381,-0.889 0.381,0.889 -0.381,0.889 -0.381,-0.889
Mechanical 29:
  text "1" at 0.203,0.45 h0.51
  text "2" at 0.203,-0.45 h0.51
3D body "CAP 0402.STEP": height 0.52, standoff 0, extent -0.262,-0.5 0.262,0.5

## RLP-132 [mm] "RLP-132"
pads (2):
  rect 1x0.95 smd: 1(0,0.8) 2(0,-0.8)
Top Overlay:
  lines w0.152: -0.5,0 0.5,0
Top 3D Body:
  lines w0.025: -0.69,-1.465 0.69,-1.465 0.69,1.465 -0.69,1.465 -0.69,-1.465
Top Assembly:
  lines w0.102: -0.5,-1.275 -0.5,1.275 0.5,1.275 0.5,-1.275 -0.5,-1.275
Mechanical 29:
  text "1" at -0.203,0.8 h0.51
  text "2" at -0.203,-0.8 h0.51
Bottom Assembly:
  text ".Designator" at -1.948,0 h1.27